# Altium footprint library texas.PCBLIB: 168 footprints (part 13 of 14)
Each footprint in its own frame and in the unit in brackets; x right, y up, seen from the top. Pads: shape width x height; smd on the part's side, far side on the other; paste and mask are expansions set on the pad; w line width, h text height; cw(c..) or ccw(c..) is an arc to the next point about the centre after c.
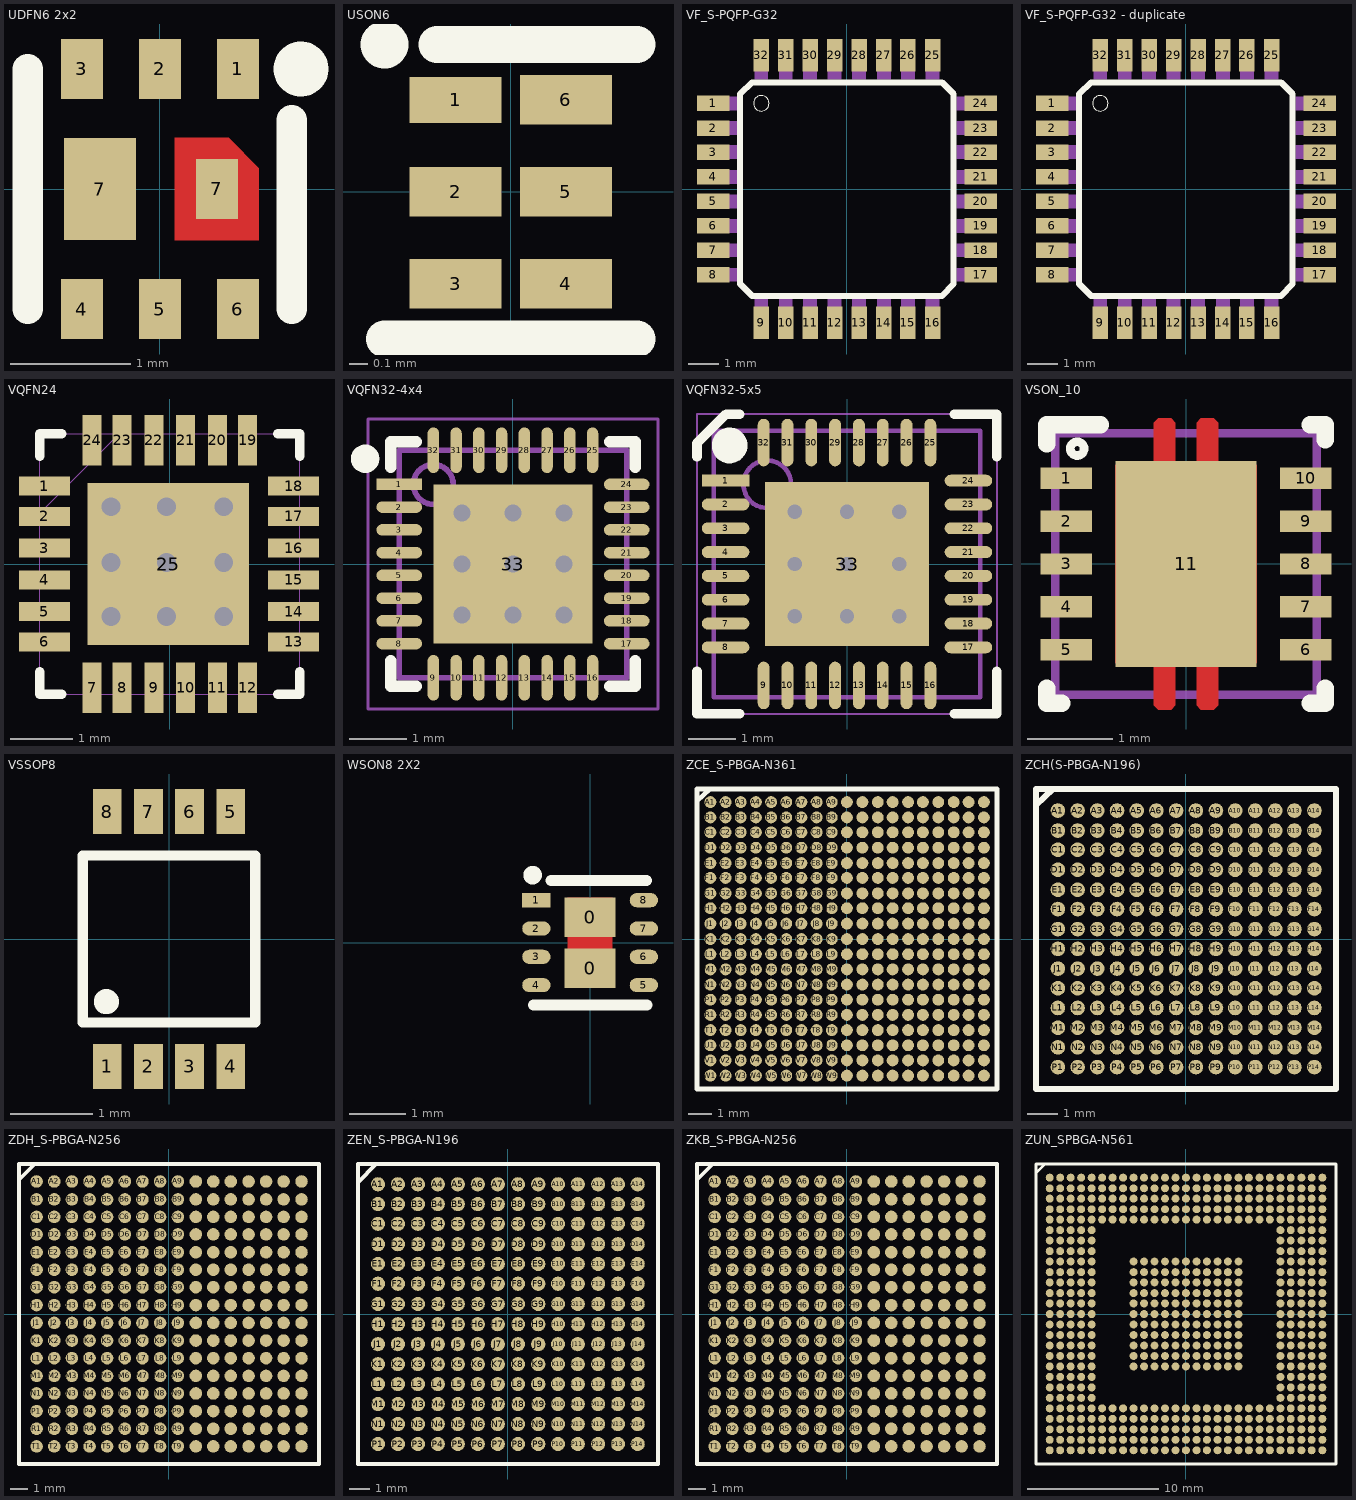
[diagram p12: the footprints below, top view; thin cyan lines are the x and y axes]

## UDFN6 2x2 [mm] "UDFN6 2x2, 0.65P  CASE 517BF"
height 0.55
pads (8):
  rect 0.35x0.5 smd: 1(0.65,1) 2(0,1) 3(-0.65,1) 4(-0.65,-1) 5(0,-1) 6(0.65,-1) 7(0.475,0.001)
  rect 0.6x0.85 smd: 7(-0.5,0)
Top Layer:
  region: 0.575,0.425 0.825,0.175 0.825,-0.425 0.125,-0.425 0.125,0.425
Top Overlay:
  circle w0.305: c1.175,1 r0.076
  lines w0.254: -1.1,-1 -1.1,1 ; 1.1,-1 1.1,0.575
Top Solder:
  region: 0.6,0.55 0.925,0.225 0.925,-0.525 0.025,-0.525 0.025,0.55
3D body: height 0.55, standoff 0, extent -1,-1 1,1

## USON6 [mm] "USON6 1x1.45"
height 0.6
pads (6):
  rect 0.5x0.25 smd mask+0.05: 1(-0.3,0.5)
  rect 0.5x0.27 smd mask+0.05: 2(-0.3,0) 3(-0.3,-0.5) 4(0.3,-0.5) 5(0.3,0) 6(0.3,0.5)
Top Overlay:
  circle w0.2: c-0.686,0.8 r0.03
  lines w0.2: -0.686,-0.8 0.686,-0.8 ; -0.4,0.8 0.686,0.8
3D body: height 0.6, standoff 0.05, extent -0.559,-0.711 0.559,0.711

## VF_S-PQFP-G32 [mil]
pads (32):
  rect 42x20 smd: 1(-172.24,111) 2(-172.24,79) 3(-172.24,48) 4(-172.24,16) 5(-172.24,-15.75) 6(-172.24,-47.24) 7(-172.24,-78.74) 8(-172.24,-110.24) 17(173,-110.24) 18(173,-78.74) 19(173,-47.24) 20(173,-15.75) 21(173,16) 22(173,48) 23(173,79) 24(173,111)
  rect 20x42 smd: 9(-110.24,-172.24) 10(-78.74,-172.24) 11(-47.24,-172.24) 12(-15.75,-172.24) 13(16,-172.24) 14(48,-172.24) 15(79,-172.24) 16(111,-172.24) 25(111,173) 26(79,173) 27(48,173) 28(16,173) 29(-15.75,173) 30(-47.24,173) 31(-78.74,173) 32(-110.24,173)
Top Overlay:
  circle w0: c-110.24,111 r10
  lines w8: -137.73,-122.05 -122.05,-137.73 123,-137.73 138,-122.05 138,123 123,138 -122.05,138 -137.73,123 -137.73,-122.05
Mechanical 4:
  rectangle: -181.1,102 -141.73,120
  rectangle: -181.1,70 -141.73,88
  rectangle: -181.1,39 -141.73,57
  rectangle: -181.1,7 -141.73,25
  rectangle: -181.1,-24.61 -141.73,-6.89
  rectangle: -181.1,-56.1 -141.73,-38.39
  rectangle: -181.1,-87.6 -141.73,-69.88
  rectangle: -181.1,-119.09 -141.73,-101.38
  rectangle: -119.09,-181.1 -101.38,-141.73
  rectangle: -87.6,-181.1 -69.88,-141.73
  rectangle: -56.1,-181.1 -38.39,-141.73
  rectangle: -24.61,-181.1 -6.89,-141.73
  rectangle: 7,-181.1 25,-141.73
  rectangle: 39,-181.1 57,-141.73
  rectangle: 70,-181.1 88,-141.73
  rectangle: 102,-181.1 120,-141.73
  rectangle: 142,-119.09 182,-101.38
  rectangle: 142,-87.6 182,-69.88
  rectangle: 142,-56.1 182,-38.39
  rectangle: 142,-24.61 182,-6.89
  rectangle: 142,7 182,25
  rectangle: 142,39 182,57
  rectangle: 142,70 182,88
  rectangle: 142,102 182,120
  rectangle: 102,142 120,182
  rectangle: 70,142 88,182
  rectangle: 39,142 57,182
  rectangle: 7,142 25,182
  rectangle: -24.61,142 -6.89,182
  rectangle: -56.1,142 -38.39,182
  rectangle: -87.6,142 -69.88,182
  rectangle: -119.09,142 -101.38,182

## VF_S-PQFP-G32 - duplicate [mil]
pads (32):
  rect 42x20 smd: 1(-172.24,111) 2(-172.24,79) 3(-172.24,48) 4(-172.24,16) 5(-172.24,-15.75) 6(-172.24,-47.24) 7(-172.24,-78.74) 8(-172.24,-110.24) 17(173,-110.24) 18(173,-78.74) 19(173,-47.24) 20(173,-15.75) 21(173,16) 22(173,48) 23(173,79) 24(173,111)
  rect 20x42 smd: 9(-110.24,-172.24) 10(-78.74,-172.24) 11(-47.24,-172.24) 12(-15.75,-172.24) 13(16,-172.24) 14(48,-172.24) 15(79,-172.24) 16(111,-172.24) 25(111,173) 26(79,173) 27(48,173) 28(16,173) 29(-15.75,173) 30(-47.24,173) 31(-78.74,173) 32(-110.24,173)
Top Overlay:
  circle w0: c-110.24,111 r10
  lines w8: -137.73,-122.05 -137.73,123 -122.05,138 123,138 138,123 138,-122.05 123,-137.73 -122.05,-137.73 -137.73,-122.05
Mechanical 4:
  rectangle: -119.09,142 -101.38,182
  rectangle: -87.6,142 -69.88,182
  rectangle: -56.1,142 -38.39,182
  rectangle: -24.61,142 -6.89,182
  rectangle: 7,142 25,182
  rectangle: 39,142 57,182
  rectangle: 70,142 88,182
  rectangle: 102,142 120,182
  rectangle: 142,102 182,120
  rectangle: 142,70 182,88
  rectangle: 142,39 182,57
  rectangle: 142,7 182,25
  rectangle: 142,-24.61 182,-6.89
  rectangle: 142,-56.1 182,-38.39
  rectangle: 142,-87.6 182,-69.88
  rectangle: 142,-119.09 182,-101.38
  rectangle: 102,-181.1 120,-141.73
  rectangle: 70,-181.1 88,-141.73
  rectangle: 39,-181.1 57,-141.73
  rectangle: 7,-181.1 25,-141.73
  rectangle: -24.61,-181.1 -6.89,-141.73
  rectangle: -56.1,-181.1 -38.39,-141.73
  rectangle: -87.6,-181.1 -69.88,-141.73
  rectangle: -119.09,-181.1 -101.38,-141.73
  rectangle: -181.1,-119.09 -141.73,-101.38
  rectangle: -181.1,-87.6 -141.73,-69.88
  rectangle: -181.1,-56.1 -141.73,-38.39
  rectangle: -181.1,-24.61 -141.73,-6.89
  rectangle: -181.1,7 -141.73,25
  rectangle: -181.1,39 -141.73,57
  rectangle: -181.1,70 -141.73,88
  rectangle: -181.1,102 -141.73,120

## VQFN24 [mil]
pads (25):
  rect 32x12 smd: 1(-79,49) 2(-79,30) 3(-79,10) 4(-79,-10) 5(-79,-30) 6(-79,-49) 13(78,-49) 14(78,-30) 15(78,-10) 16(78,10) 17(78,30) 18(78,49)
  rect 12x32 smd: 7(-49,-78) 8(-30,-78) 9(-10,-78) 10(10,-78) 11(30,-78) 12(49,-78) 19(49,78) 20(30,78) 21(10,78) 22(-10,78) 23(-30,78) 24(-49,78)
  rect 102x102 smd: 25(-1,0)
via 34,-33 diameter 19.68 hole 11.81
via -2,-33 diameter 19.68 hole 11.81
via -37,-33 diameter 19.68 hole 11.81
via 34,1 diameter 19.68 hole 11.81
via -2,1 diameter 19.68 hole 11.81
via -37,1 diameter 19.68 hole 11.81
via 34,36 diameter 19.68 hole 11.81
via -2,36 diameter 19.68 hole 11.81
via -37,36 diameter 19.68 hole 11.81
Top Overlay:
  lines w6: -82,-68 -82,-82 -68,-82 ; -82,68 -82,82 -68,82 ; 68,-82 82,-82 82,-68 ; 68,82 82,82 82,68
Mechanical 4:
  lines w0: -82,-82 82,-82 ; -82,-82 -82,82 ; -82,-82 82,-82 ; -82,-82 -82,82 ; -82,82 82,82 ; -82,82 82,82 ; 82,-82 82,82 ; 82,-82 82,82 ; -82,-55 -82,-43 -82,-55 ; -82,-35 -82,-24 -82,-35 ; -82,-16 -82,-4 -82,-16 ; -82,4 -82,16 -82,4 ; -82,24 -82,35 -82,24 ; -82,32 -32,82 -82,32 ; -82,43 -82,55 -82,43 ; -55,-82 -43,-82 -55,-82 ; -55,82 -43,82 -55,82 ; -35,-82 -24,-82 -35,-82 ; -35,82 -24,82 -35,82 ; -16,-82 -4,-82 -16,-82 ; -16,82 -4,82 -16,82 ; 4,-82 16,-82 4,-82 ; 4,82 16,82 4,82 ; 24,-82 35,-82 24,-82 ; 24,82 35,82 24,82 ; 43,-82 55,-82 43,-82 ; 43,82 55,82 43,82 ; 82,-55 82,-43 82,-55 ; 82,-35 82,-24 82,-35 ; 82,-16 82,-4 82,-16 ; 82,4 82,16 82,4 ; 82,24 82,35 82,24 ; 82,43 82,55 82,43

## VQFN32-4x4 [mm] "QFN, 32-Leads, Body 4x4mm, Pitch 0.4mm, Thermal Pad 2.8x2.8mm, IPC Medium Density"
height 1
pads (33):
  rect 0.8x0.2 smd: 1(-2,1.4)
  oval 0.8x0.2 smd: 2(-2,1) 3(-2,0.6) 4(-2,0.2) 5(-2,-0.2) 6(-2,-0.6) 7(-2,-1) 8(-2,-1.4) 17(2,-1.4) 18(2,-1) 19(2,-0.6) 20(2,-0.2) 21(2,0.2) 22(2,0.6) 23(2,1) 24(2,1.4)
  oval 0.2x0.8 smd: 9(-1.4,-2) 10(-1,-2) 11(-0.6,-2) 12(-0.2,-2) 13(0.2,-2) 14(0.6,-2) 15(1,-2) 16(1.4,-2) 25(1.4,2) 26(1,2) 27(0.6,2) 28(0.2,2) 29(-0.2,2) 30(-0.6,2) 31(-1,2) 32(-1.4,2)
  rect 2.8x2.8 smd: 33(0,0)
via 0.9,-0.9 diameter 0.5 hole 0.3
via 0,-0.9 diameter 0.5 hole 0.3
via -0.9,-0.9 diameter 0.5 hole 0.3
via 0.9,0 diameter 0.5 hole 0.3
via 0,0 diameter 0.5 hole 0.3
via -0.9,0 diameter 0.5 hole 0.3
via 0.9,0.9 diameter 0.5 hole 0.3
via 0,0.9 diameter 0.5 hole 0.3
via -0.9,0.9 diameter 0.5 hole 0.3
Top Overlay:
  circle w0.25: c-2.6,1.85 r0.125
  lines w0.2: -2.15,-1.7 -2.15,-2.15 -1.7,-2.15 ; -2.15,1.7 -2.15,2.15 -1.7,2.15 ; 1.7,-2.15 2.15,-2.15 2.15,-1.7 ; 1.7,2.15 2.15,2.15 2.15,1.7
Mechanical 13:
  circle w0.1: c-1.4,1.4 r0.35
  lines w0.1: -2,-2 2,-2 2,2 -2,2 -2,-2
Mechanical 15:
  lines w0.05: -2.55,-2.55 2.55,-2.55 2.55,2.55 -2.55,2.55 -2.55,-2.55
  lines w0.1: -0.5,0 0.5,0 ; 0,-0.5 0,0.5
3D body: height 1, standoff 0, extent -2,-2 2,2

## VQFN32-5x5 [mm] "QFN, 32-Leads, Body 5x5mm, Pitch 0.5mm, Thermal Pad 3.45x3.45mm, IPC Medium Density"
height 1
pads (33):
  rect 1x0.25 smd: 1(-2.55,1.75)
  oval 1x0.25 smd: 2(-2.55,1.25) 3(-2.55,0.75) 4(-2.55,0.25) 5(-2.55,-0.25) 6(-2.55,-0.75) 7(-2.55,-1.25) 8(-2.55,-1.75) 17(2.55,-1.75) 18(2.55,-1.25) 19(2.55,-0.75) 20(2.55,-0.25) 21(2.55,0.25) 22(2.55,0.75) 23(2.55,1.25) 24(2.55,1.75)
  oval 0.25x1 smd: 9(-1.75,-2.55) 10(-1.25,-2.55) 11(-0.75,-2.55) 12(-0.25,-2.55) 13(0.25,-2.55) 14(0.75,-2.55) 15(1.25,-2.55) 16(1.75,-2.55) 25(1.75,2.55) 26(1.25,2.55) 27(0.75,2.55) 28(0.25,2.55) 29(-0.25,2.55) 30(-0.75,2.55) 31(-1.25,2.55) 32(-1.75,2.55)
  rect 3.45x3.45 smd: 33(0,0)
via -1.1,1.1 diameter 0.5 hole 0.3
via 0,1.1 diameter 0.5 hole 0.3
via 1.1,1.1 diameter 0.5 hole 0.3
via -1.1,0 diameter 0.5 hole 0.3
via 0,0 diameter 0.5 hole 0.3
via 1.1,0 diameter 0.5 hole 0.3
via -1.1,-1.1 diameter 0.5 hole 0.3
via 0,-1.1 diameter 0.5 hole 0.3
via 1.1,-1.1 diameter 0.5 hole 0.3
Top Overlay:
  circle w0.4: c-2.464,2.489 r0.175
  lines w0.2: -3.15,-2.25 -3.15,-3.15 -2.25,-3.15 ; -3.15,2.25 -3.15,2.54 -2.54,3.15 -2.25,3.15 ; 2.25,-3.15 3.15,-3.15 3.15,-2.25 ; 2.25,3.15 3.15,3.15 3.15,2.25
Mechanical 13:
  circle w0.1: c-1.675,1.675 r0.5
  lines w0.1: -2.8,-2.8 -2.8,2.8 2.8,2.8 2.8,-2.8 -2.8,-2.8
Mechanical 15:
  lines w0.05: -3.15,-3.15 -3.15,3.15 3.15,3.15 3.15,-3.15 -3.15,-3.15
  lines w0.1: -0.5,0 0.5,0 ; 0,-0.5 0,0.5
3D body: height 1, standoff 0, extent -2.794,-2.794 2.794,2.794

## VSON_10 [mm]
pads (11):
  rect 0.6x0.25 smd paste+0 mask+0.051: 1(-1.4,1) 2(-1.4,0.5) 3(-1.4,0) 4(-1.4,-0.5) 5(-1.4,-1) 6(1.4,-1) 7(1.4,-0.5) 8(1.4,0) 9(1.4,0.5) 10(1.4,1)
  rect 1.65x2.4 smd paste-1.187 mask-1.181: 11(0,0)
Top Layer:
  region: -0.825,-1.15 -0.775,-1.2 -0.375,-1.2 -0.375,-1.65 -0.325,-1.7 -0.175,-1.7 -0.125,-1.65 -0.125,-1.2 0.125,-1.2 0.125,-1.65 0.175,-1.7 0.325,-1.7 0.375,-1.65 0.375,-1.2 0.775,-1.2 0.825,-1.15 0.825,1.15 0.775,1.2 0.375,1.2 0.375,1.65 0.325,1.7 0.175,1.7 0.125,1.65 0.125,1.2 -0.125,1.2 -0.125,1.65 -0.175,1.7 -0.325,1.7 -0.375,1.65 -0.375,1.2 -0.775,1.2 -0.825,1.15
Top Overlay:
  circle w0.1: c-1.27,1.346 r0.08
  lines w0.2: -1.625,-1.45 -1.625,-1.625 -1.45,-1.625 ; -1.625,1.4 -1.625,1.625 -1,1.625 ; 1.45,-1.625 1.625,-1.625 1.625,-1.45 ; 1.45,1.625 1.625,1.625 1.625,1.45
Top Paste:
  drawing of 6 lines, arcs and shapes, not listed
Top Solder:
  region: -0.803,-1.242 -0.811,-1.236 -0.861,-1.186 -0.867,-1.178 -0.872,-1.169 -0.875,-1.16 -0.876,-1.15 -0.876,1.15 -0.875,1.16 -0.872,1.169 -0.867,1.178 -0.861,1.186 -0.811,1.236 -0.803,1.242 -0.794,1.247 -0.785,1.25 -0.775,1.251 -0.426,1.251 -0.426,1.65 -0.425,1.66 -0.422,1.669 -0.417,1.678 -0.411,1.686 -0.361,1.736 -0.353,1.742 -0.344,1.747 -0.335,1.75 -0.325,1.751 -0.175,1.751 -0.165,1.75 -0.156,1.747 -0.147,1.742 -0.139,1.736 -0.089,1.686 -0.083,1.678 -0.078,1.669 -0.075,1.66 -0.074,1.65 -0.074,1.251 0.074,1.251 0.074,1.65 0.075,1.66 0.078,1.669 0.083,1.678 0.089,1.686 0.139,1.736 0.147,1.742 0.156,1.747 0.165,1.75 0.175,1.751 0.325,1.751 0.335,1.75 0.344,1.747 0.353,1.742 0.361,1.736 0.411,1.686 0.417,1.678 0.422,1.669 0.425,1.66 0.426,1.65 0.426,1.251 0.775,1.251 0.785,1.25 0.794,1.247 0.803,1.242 0.811,1.236 0.861,1.186 0.867,1.178 0.872,1.169 0.875,1.16 0.876,1.15 0.876,-1.15 0.875,-1.16 0.872,-1.169 0.867,-1.178 0.861,-1.186 0.811,-1.236 0.803,-1.242 0.794,-1.247 0.785,-1.25 0.775,-1.251 0.426,-1.251 0.426,-1.65 0.425,-1.66 0.422,-1.669 0.417,-1.678 0.411,-1.686 0.361,-1.736 0.353,-1.742 0.344,-1.747 0.335,-1.75 0.325,-1.751 0.175,-1.751 0.165,-1.75 0.156,-1.747 0.147,-1.742 0.139,-1.736 0.089,-1.686 0.083,-1.678 0.078,-1.669 0.075,-1.66 0.074,-1.65 0.074,-1.251 -0.074,-1.251 -0.074,-1.65 -0.075,-1.66 -0.078,-1.669 -0.083,-1.678 -0.089,-1.686 -0.139,-1.736 -0.147,-1.742 -0.156,-1.747 -0.165,-1.75 -0.175,-1.751 -0.325,-1.751 -0.335,-1.75 -0.344,-1.747 -0.353,-1.742 -0.361,-1.736 -0.411,-1.686 -0.417,-1.678 -0.422,-1.669 -0.425,-1.66 -0.426,-1.65 -0.426,-1.251 -0.775,-1.251 -0.785,-1.25 -0.794,-1.247
Mechanical 4:
  lines w0.1: -1.525,-1.525 -1.525,1.525 1.525,1.525 1.525,-1.525 -1.525,-1.525
3D body "DRC0010J.stp": height 0.77, standoff 0, extent -1.5,-1.5 1.5,1.5
3D body: height 0.25, standoff 0, extent 0,0 0.254,0.254

## VSSOP8 [mm]
pads (8):
  rect 0.35x0.55 smd: 1(-0.75,-1.55) 2(-0.25,-1.55) 3(0.25,-1.55) 4(0.75,-1.55) 5(0.75,1.55) 6(0.25,1.55) 7(-0.25,1.55) 8(-0.75,1.55)
Top Overlay:
  circle w0.254: c-0.762,-0.762 r0.025
  lines w0.127: -1.05,-1.016 1.05,-1.016 1.05,1.016 0.525,1.016 -0.525,1.016 -1.05,1.016 -1.05,-1.016
3D body "User Library-SOP50P310X90-8N[8US8_VSSOP_DCU_MO-187CA].step": height 0.9, standoff 0, extent -1.05,-1.6 1.05,1.6

## WSON8 2X2 [mm]
height 0.8
pads (10):
  rect 0.9x0.7 smd paste+0: 0(0,-0.45) 0(0,0.45)
  rect 0.5x0.25 smd mask+0.051: 1(-0.95,0.75)
  oval 0.5x0.25 smd mask+0.051: 2(-0.95,0.25) 3(-0.95,-0.25) 4(-0.95,-0.75) 5(0.95,-0.75) 6(0.95,-0.25) 7(0.95,0.25) 8(0.95,0.75)
Top Layer:
  rectangle: -0.4,-0.8 0.4,0.8
Top Overlay:
  circle w0.254: c-1.016,1.194 r0.036
  lines w0.2: -1,-1.1 1,-1.1 ; -0.689,1.1 0.991,1.1
Top Paste:
  region: -4.102,-0.279
Top Solder:
  rectangle: -0.4,-0.8 0.4,0.8
3D body: height 0.8, standoff 0.05, extent -1.016,-1.016 1.016,1.016

## ZCE_S-PBGA-N361 [mil]
pads (361):
  rrect100% 20x20 smd: A1(-230.31,231) A2(-204.72,231) A3(-179.13,231) A4(-153.54,231) A5(-127.95,231) A6(-102.36,231) A7(-76.77,231) A8(-51.18,231) A9(-25.59,231) A10(0,231) A11(26,231) A12(52,231) A13(77,231) A14(103,231) A15(128,231) A16(154,231) A17(180,231) A18(205,231) A19(231,231) B1(-230.31,205) B2(-204.72,205) B3(-179.13,205) B4(-153.54,205) B5(-127.95,205) B6(-102.36,205) B7(-76.77,205) B8(-51.18,205) B9(-25.59,205) B10(0,205) B11(26,205) B12(52,205) B13(77,205) B14(103,205) B15(128,205) B16(154,205) B17(180,205) B18(205,205) B19(231,205) C1(-230.31,180) C2(-204.72,180) C3(-179.13,180) C4(-153.54,180) C5(-127.95,180) C6(-102.36,180) C7(-76.77,180) C8(-51.18,180) C9(-25.59,180) C10(0,180) C11(26,180) C12(52,180) C13(77,180) C14(103,180) C15(128,180) C16(154,180) C17(180,180) C18(205,180) C19(231,180) D1(-230.31,154) D2(-204.72,154) D3(-179.13,154) D4(-153.54,154) D5(-127.95,154) D6(-102.36,154) D7(-76.77,154) D8(-51.18,154) D9(-25.59,154) D10(0,154) D11(26,154) D12(52,154) D13(77,154) D14(103,154) D15(128,154) D16(154,154) D17(180,154) D18(205,154) D19(231,154) E1(-230.31,128) E2(-204.72,128) E3(-179.13,128) E4(-153.54,128) E5(-127.95,128) E6(-102.36,128) E7(-76.77,128) E8(-51.18,128) E9(-25.59,128) E10(0,128) E11(26,128) E12(52,128) E13(77,128) E14(103,128) E15(128,128) E16(154,128) E17(180,128) E18(205,128) E19(231,128) F1(-230.31,103) F2(-204.72,103) F3(-179.13,103) F4(-153.54,103) F5(-127.95,103) F6(-102.36,103) F7(-76.77,103) F8(-51.18,103) F9(-25.59,103) F10(0,103) F11(26,103) F12(52,103) F13(77,103) F14(103,103) F15(128,103) F16(154,103) F17(180,103) F18(205,103) F19(231,103) G1(-230.31,77) G2(-204.72,77) G3(-179.13,77) G4(-153.54,77) G5(-127.95,77) G6(-102.36,77) G7(-76.77,77) G8(-51.18,77) G9(-25.59,77) G10(0,77) G11(26,77) G12(52,77) G13(77,77) G14(103,77) G15(128,77) G16(154,77) G17(180,77) G18(205,77) G19(231,77) H1(-230.31,52) H2(-204.72,52) H3(-179.13,52) H4(-153.54,52) H5(-127.95,52) H6(-102.36,52) H7(-76.77,52) H8(-51.18,52) H9(-25.59,52) H10(0,52) H11(26,52) H12(52,52) H13(77,52) H14(103,52) H15(128,52) H16(154,52) H17(180,52) H18(205,52) H19(231,52) J1(-230.31,26) J2(-204.72,26) J3(-179.13,26) J4(-153.54,26) J5(-127.95,26) J6(-102.36,26) J7(-76.77,26) J8(-51.18,26) J9(-25.59,26) J10(0,26) J11(26,26) J12(52,26) J13(77,26) J14(103,26) J15(128,26) J16(154,26) J17(180,26) J18(205,26) J19(231,26) K1(-230.31,0) K2(-204.72,0) K3(-179.13,0) K4(-153.54,0) K5(-127.95,0) K6(-102.36,0) K7(-76.77,0) K8(-51.18,0) K9(-25.59,0) K10(0,0) K11(26,0) K12(52,0) K13(77,0) K14(103,0) K15(128,0) K16(154,0) K17(180,0) K18(205,0) K19(231,0) L1(-230.31,-25.59) L2(-204.72,-25.59) L3(-179.13,-25.59) L4(-153.54,-25.59) L5(-127.95,-25.59) L6(-102.36,-25.59) L7(-76.77,-25.59) L8(-51.18,-25.59) L9(-25.59,-25.59) L10(0,-25.59) L11(26,-25.59) L12(52,-25.59) L13(77,-25.59) L14(103,-25.59) L15(128,-25.59) L16(154,-25.59) L17(180,-25.59) L18(205,-25.59) L19(231,-25.59) M1(-230.31,-51.18) M2(-204.72,-51.18) M3(-179.13,-51.18) M4(-153.54,-51.18) M5(-127.95,-51.18) M6(-102.36,-51.18) M7(-76.77,-51.18) M8(-51.18,-51.18) M9(-25.59,-51.18) M10(0,-51.18) M11(26,-51.18) M12(52,-51.18) M13(77,-51.18) M14(103,-51.18) M15(128,-51.18) M16(154,-51.18) M17(180,-51.18) M18(205,-51.18) M19(231,-51.18) N1(-230.31,-76.77) N2(-204.72,-76.77) N3(-179.13,-76.77) N4(-153.54,-76.77) N5(-127.95,-76.77) N6(-102.36,-76.77) N7(-76.77,-76.77) N8(-51.18,-76.77) N9(-25.59,-76.77) N10(0,-76.77) N11(26,-76.77) N12(52,-76.77) N13(77,-76.77) N14(103,-76.77) N15(128,-76.77) N16(154,-76.77) N17(180,-76.77) N18(205,-76.77) N19(231,-76.77) P1(-230.31,-102.36) P2(-204.72,-102.36) P3(-179.13,-102.36) P4(-153.54,-102.36) P5(-127.95,-102.36) P6(-102.36,-102.36) P7(-76.77,-102.36) P8(-51.18,-102.36) P9(-25.59,-102.36) P10(0,-102.36) P11(26,-102.36) P12(52,-102.36) P13(77,-102.36) P14(103,-102.36) P15(128,-102.36) P16(154,-102.36) P17(180,-102.36) P18(205,-102.36) P19(231,-102.36) R1(-230.31,-127.95) R2(-204.72,-127.95) R3(-179.13,-127.95) R4(-153.54,-127.95) R5(-127.95,-127.95) R6(-102.36,-127.95) R7(-76.77,-127.95) R8(-51.18,-127.95) R9(-25.59,-127.95) R10(0,-127.95) R11(26,-127.95) R12(52,-127.95) R13(77,-127.95) R14(103,-127.95) R15(128,-127.95) R16(154,-127.95) R17(180,-127.95) R18(205,-127.95) R19(231,-127.95) T1(-230.31,-153.54) T2(-204.72,-153.54) T3(-179.13,-153.54) T4(-153.54,-153.54) T5(-127.95,-153.54) T6(-102.36,-153.54) T7(-76.77,-153.54) T8(-51.18,-153.54) T9(-25.59,-153.54) T10(0,-153.54) T11(26,-153.54) T12(52,-153.54) T13(77,-153.54) T14(103,-153.54) T15(128,-153.54) T16(154,-153.54) T17(180,-153.54) T18(205,-153.54) T19(231,-153.54) U1(-230.31,-179.13) U2(-204.72,-179.13) U3(-179.13,-179.13) U4(-153.54,-179.13) U5(-127.95,-179.13) U6(-102.36,-179.13) U7(-76.77,-179.13) U8(-51.18,-179.13) U9(-25.59,-179.13) U10(0,-179.13) U11(26,-179.13) U12(52,-179.13) U13(77,-179.13) U14(103,-179.13) U15(128,-179.13) U16(154,-179.13) U17(180,-179.13) U18(205,-179.13) U19(231,-179.13) V1(-230.31,-204.72) V2(-204.72,-204.72) V3(-179.13,-204.72) V4(-153.54,-204.72) V5(-127.95,-204.72) V6(-102.36,-204.72) V7(-76.77,-204.72) V8(-51.18,-204.72) V9(-25.59,-204.72) V10(0,-204.72) V11(26,-204.72) V12(52,-204.72) V13(77,-204.72) V14(103,-204.72) V15(128,-204.72) V16(154,-204.72) V17(180,-204.72) V18(205,-204.72) V19(231,-204.72) W1(-230.31,-230.31) W2(-204.72,-230.31) W3(-179.13,-230.31) W4(-153.54,-230.31) W5(-127.95,-230.31) W6(-102.36,-230.31) W7(-76.77,-230.31) W8(-51.18,-230.31) W9(-25.59,-230.31) W10(0,-230.31) W11(26,-230.31) W12(52,-230.31) W13(77,-230.31) W14(103,-230.31) W15(128,-230.31) W16(154,-230.31) W17(180,-230.31) W18(205,-230.31) W19(231,-230.31)
Top Overlay:
  lines w8: -252.89,232 -231.3,253 ; -252.89,232 -252.89,-252.89 253,-252.89 253,253 -231.3,253 ; -252.89,232 -252.89,253 -231.3,253
Top Solder:
  drawing of 361 lines, arcs and shapes, not listed

## ZCH(S-PBGA-N196) [mil]
pads (196):
  rrect100% 19x19 smd: A1(-166.34,167) A2(-140.75,167) A3(-115.16,167) A4(-89.57,167) A5(-63.98,167) A6(-38.39,167) A7(-12.8,167) A8(13,167) A9(39,167) A10(64,167) A11(90,167) A12(116,167) A13(141,167) A14(167,167) B1(-166.34,141) B2(-140.75,141) B3(-115.16,141) B4(-89.57,141) B5(-63.98,141) B6(-38.39,141) B7(-12.8,141) B8(13,141) B9(39,141) B10(64,141) B11(90,141) B12(116,141) B13(141,141) B14(167,141) C1(-166.34,116) C2(-140.75,116) C3(-115.16,116) C4(-89.57,116) C5(-63.98,116) C6(-38.39,116) C7(-12.8,116) C8(13,116) C9(39,116) C10(64,116) C11(90,116) C12(116,116) C13(141,116) C14(167,116) D1(-166.34,90) D2(-140.75,90) D3(-115.16,90) D4(-89.57,90) D5(-63.98,90) D6(-38.39,90) D7(-12.8,90) D8(13,90) D9(39,90) D10(64,90) D11(90,90) D12(116,90) D13(141,90) D14(167,90) E1(-166.34,64) E2(-140.75,64) E3(-115.16,64) E4(-89.57,64) E5(-63.98,64) E6(-38.39,64) E7(-12.8,64) E8(13,64) E9(39,64) E10(64,64) E11(90,64) E12(116,64) E13(141,64) E14(167,64) F1(-166.34,39) F2(-140.75,39) F3(-115.16,39) F4(-89.57,39) F5(-63.98,39) F6(-38.39,39) F7(-12.8,39) F8(13,39) F9(39,39) F10(64,39) F11(90,39) F12(116,39) F13(141,39) F14(167,39) G1(-166.34,13) G2(-140.75,13) G3(-115.16,13) G4(-89.57,13) G5(-63.98,13) G6(-38.39,13) G7(-12.8,13) G8(13,13) G9(39,13) G10(64,13) G11(90,13) G12(116,13) G13(141,13) G14(167,13) H1(-166.34,-12.8) H2(-140.75,-12.8) H3(-115.16,-12.8) H4(-89.57,-12.8) H5(-63.98,-12.8) H6(-38.39,-12.8) H7(-12.8,-12.8) H8(13,-12.8) H9(39,-12.8) H10(64,-12.8) H11(90,-12.8) H12(116,-12.8) H13(141,-12.8) H14(167,-12.8) J1(-166.34,-38.39) J2(-140.75,-38.39) J3(-115.16,-38.39) J4(-89.57,-38.39) J5(-63.98,-38.39) J6(-38.39,-38.39) J7(-12.8,-38.39) J8(13,-38.39) J9(39,-38.39) J10(64,-38.39) J11(90,-38.39) J12(116,-38.39) J13(141,-38.39) J14(167,-38.39) K1(-166.34,-63.98) K2(-140.75,-63.98) K3(-115.16,-63.98) K4(-89.57,-63.98) K5(-63.98,-63.98) K6(-38.39,-63.98) K7(-12.8,-63.98) K8(13,-63.98) K9(39,-63.98) K10(64,-63.98) K11(90,-63.98) K12(116,-63.98) K13(141,-63.98) K14(167,-63.98) L1(-166.34,-89.57) L2(-140.75,-89.57) L3(-115.16,-89.57) L4(-89.57,-89.57) L5(-63.98,-89.57) L6(-38.39,-89.57) L7(-12.8,-89.57) L8(13,-89.57) L9(39,-89.57) L10(64,-89.57) L11(90,-89.57) L12(116,-89.57) L13(141,-89.57) L14(167,-89.57) M1(-166.34,-115.16) M2(-140.75,-115.16) M3(-115.16,-115.16) M4(-89.57,-115.16) M5(-63.98,-115.16) M6(-38.39,-115.16) M7(-12.8,-115.16) M8(13,-115.16) M9(39,-115.16) M10(64,-115.16) M11(90,-115.16) M12(116,-115.16) M13(141,-115.16) M14(167,-115.16) N1(-166.34,-140.75) N2(-140.75,-140.75) N3(-115.16,-140.75) N4(-89.57,-140.75) N5(-63.98,-140.75) N6(-38.39,-140.75) N7(-12.8,-140.75) N8(13,-140.75) N9(39,-140.75) N10(64,-140.75) N11(90,-140.75) N12(116,-140.75) N13(141,-140.75) N14(167,-140.75) P1(-166.34,-166.34) P2(-140.75,-166.34) P3(-115.16,-166.34) P4(-89.57,-166.34) P5(-63.98,-166.34) P6(-38.39,-166.34) P7(-12.8,-166.34) P8(13,-166.34) P9(39,-166.34) P10(64,-166.34) P11(90,-166.34) P12(116,-166.34) P13(141,-166.34) P14(167,-166.34)
Top Overlay:
  lines w8: -194.82,174 -173.23,195 ; -194.82,174 -194.82,-194.82 195,-194.82 195,195 -173.23,195 ; -194.82,174 -194.82,195 -173.23,195
Top Solder:
  drawing of 196 lines, arcs and shapes, not listed

## ZDH_S-PBGA-N256 [mil]
pads (256):
  rrect100% 28x28 smd: A1(-295.28,296) A2(-255.91,296) A3(-216.54,296) A4(-177.17,296) A5(-137.8,296) A6(-98.43,296) A7(-59.06,296) A8(-19.68,296) A9(20,296) A10(60,296) A11(99,296) A12(138,296) A13(178,296) A14(217,296) A15(256,296) A16(296,296) B1(-295.28,256) B2(-255.91,256) B3(-216.54,256) B4(-177.17,256) B5(-137.8,256) B6(-98.43,256) B7(-59.06,256) B8(-19.68,256) B9(20,256) B10(60,256) B11(99,256) B12(138,256) B13(178,256) B14(217,256) B15(256,256) B16(296,256) C1(-295.28,217) C2(-255.91,217) C3(-216.54,217) C4(-177.17,217) C5(-137.8,217) C6(-98.43,217) C7(-59.06,217) C8(-19.68,217) C9(20,217) C10(60,217) C11(99,217) C12(138,217) C13(178,217) C14(217,217) C15(256,217) C16(296,217) D1(-295.28,178) D2(-255.91,178) D3(-216.54,178) D4(-177.17,178) D5(-137.8,178) D6(-98.43,178) D7(-59.06,178) D8(-19.68,178) D9(20,178) D10(60,178) D11(99,178) D12(138,178) D13(178,178) D14(217,178) D15(256,178) D16(296,178) E1(-295.28,138) E2(-255.91,138) E3(-216.54,138) E4(-177.17,138) E5(-137.8,138) E6(-98.43,138) E7(-59.06,138) E8(-19.68,138) E9(20,138) E10(60,138) E11(99,138) E12(138,138) E13(178,138) E14(217,138) E15(256,138) E16(296,138) F1(-295.28,99) F2(-255.91,99) F3(-216.54,99) F4(-177.17,99) F5(-137.8,99) F6(-98.43,99) F7(-59.06,99) F8(-19.68,99) F9(20,99) F10(60,99) F11(99,99) F12(138,99) F13(178,99) F14(217,99) F15(256,99) F16(296,99) G1(-295.28,60) G2(-255.91,60) G3(-216.54,60) G4(-177.17,60) G5(-137.8,60) G6(-98.43,60) G7(-59.06,60) G8(-19.68,60) G9(20,60) G10(60,60) G11(99,60) G12(138,60) G13(178,60) G14(217,60) G15(256,60) G16(296,60) H1(-295.28,20) H2(-255.91,20) H3(-216.54,20) H4(-177.17,20) H5(-137.8,20) H6(-98.43,20) H7(-59.06,20) H8(-19.68,20) H9(20,20) H10(60,20) H11(99,20) H12(138,20) H13(178,20) H14(217,20) H15(256,20) H16(296,20) J1(-295.28,-19.68) J2(-255.91,-19.68) J3(-216.54,-19.68) J4(-177.17,-19.68) J5(-137.8,-19.68) J6(-98.43,-19.68) J7(-59.06,-19.68) J8(-19.68,-19.68) J9(20,-19.68) J10(60,-19.68) J11(99,-19.68) J12(138,-19.68) J13(178,-19.68) J14(217,-19.68) J15(256,-19.68) J16(296,-19.68) K1(-295.28,-59.06) K2(-255.91,-59.06) K3(-216.54,-59.06) K4(-177.17,-59.06) K5(-137.8,-59.06) K6(-98.43,-59.06) K7(-59.06,-59.06) K8(-19.68,-59.06) K9(20,-59.06) K10(60,-59.06) K11(99,-59.06) K12(138,-59.06) K13(178,-59.06) K14(217,-59.06) K15(256,-59.06) K16(296,-59.06) L1(-295.28,-98.43) L2(-255.91,-98.43) L3(-216.54,-98.43) L4(-177.17,-98.43) L5(-137.8,-98.43) L6(-98.43,-98.43) L7(-59.06,-98.43) L8(-19.68,-98.43) L9(20,-98.43) L10(60,-98.43) L11(99,-98.43) L12(138,-98.43) L13(178,-98.43) L14(217,-98.43) L15(256,-98.43) L16(296,-98.43) M1(-295.28,-137.8) M2(-255.91,-137.8) M3(-216.54,-137.8) M4(-177.17,-137.8) M5(-137.8,-137.8) M6(-98.43,-137.8) M7(-59.06,-137.8) M8(-19.68,-137.8) M9(20,-137.8) M10(60,-137.8) M11(99,-137.8) M12(138,-137.8) M13(178,-137.8) M14(217,-137.8) M15(256,-137.8) M16(296,-137.8) N1(-295.28,-177.17) N2(-255.91,-177.17) N3(-216.54,-177.17) N4(-177.17,-177.17) N5(-137.8,-177.17) N6(-98.43,-177.17) N7(-59.06,-177.17) N8(-19.68,-177.17) N9(20,-177.17) N10(60,-177.17) N11(99,-177.17) N12(138,-177.17) N13(178,-177.17) N14(217,-177.17) N15(256,-177.17) N16(296,-177.17) P1(-295.28,-216.54) P2(-255.91,-216.54) P3(-216.54,-216.54) P4(-177.17,-216.54) P5(-137.8,-216.54) P6(-98.43,-216.54) P7(-59.06,-216.54) P8(-19.68,-216.54) P9(20,-216.54) P10(60,-216.54) P11(99,-216.54) P12(138,-216.54) P13(178,-216.54) P14(217,-216.54) P15(256,-216.54) P16(296,-216.54) R1(-295.28,-255.91) R2(-255.91,-255.91) R3(-216.54,-255.91) R4(-177.17,-255.91) R5(-137.8,-255.91) R6(-98.43,-255.91) R7(-59.06,-255.91) R8(-19.68,-255.91) R9(20,-255.91) R10(60,-255.91) R11(99,-255.91) R12(138,-255.91) R13(178,-255.91) R14(217,-255.91) R15(256,-255.91) R16(296,-255.91) T1(-295.28,-295.28) T2(-255.91,-295.28) T3(-216.54,-295.28) T4(-177.17,-295.28) T5(-137.8,-295.28) T6(-98.43,-295.28) T7(-59.06,-295.28) T8(-19.68,-295.28) T9(20,-295.28) T10(60,-295.28) T11(99,-295.28) T12(138,-295.28) T13(178,-295.28) T14(217,-295.28) T15(256,-295.28) T16(296,-295.28)
Top Overlay:
  lines w8: -334.58,300 -299.21,335 ; -334.58,300 -334.58,-334.58 335,-334.58 335,335 -299.21,335 ; -334.58,300 -334.58,335 -299.21,335
Top Solder:
  drawing of 256 lines, arcs and shapes, not listed

## ZEN_S-PBGA-N196 [mil]
pads (196):
  rrect100% 28x28 smd: A1(-255.91,256) A2(-216.54,256) A3(-177.17,256) A4(-137.8,256) A5(-98.43,256) A6(-59.06,256) A7(-19.68,256) A8(20,256) A9(60,256) A10(99,256) A11(138,256) A12(178,256) A13(217,256) A14(256,256) B1(-255.91,217) B2(-216.54,217) B3(-177.17,217) B4(-137.8,217) B5(-98.43,217) B6(-59.06,217) B7(-19.68,217) B8(20,217) B9(60,217) B10(99,217) B11(138,217) B12(178,217) B13(217,217) B14(256,217) C1(-255.91,178) C2(-216.54,178) C3(-177.17,178) C4(-137.8,178) C5(-98.43,178) C6(-59.06,178) C7(-19.68,178) C8(20,178) C9(60,178) C10(99,178) C11(138,178) C12(178,178) C13(217,178) C14(256,178) D1(-255.91,138) D2(-216.54,138) D3(-177.17,138) D4(-137.8,138) D5(-98.43,138) D6(-59.06,138) D7(-19.68,138) D8(20,138) D9(60,138) D10(99,138) D11(138,138) D12(178,138) D13(217,138) D14(256,138) E1(-255.91,99) E2(-216.54,99) E3(-177.17,99) E4(-137.8,99) E5(-98.43,99) E6(-59.06,99) E7(-19.68,99) E8(20,99) E9(60,99) E10(99,99) E11(138,99) E12(178,99) E13(217,99) E14(256,99) F1(-255.91,60) F2(-216.54,60) F3(-177.17,60) F4(-137.8,60) F5(-98.43,60) F6(-59.06,60) F7(-19.68,60) F8(20,60) F9(60,60) F10(99,60) F11(138,60) F12(178,60) F13(217,60) F14(256,60) G1(-255.91,20) G2(-216.54,20) G3(-177.17,20) G4(-137.8,20) G5(-98.43,20) G6(-59.06,20) G7(-19.68,20) G8(20,20) G9(60,20) G10(99,20) G11(138,20) G12(178,20) G13(217,20) G14(256,20) H1(-255.91,-19.68) H2(-216.54,-19.68) H3(-177.17,-19.68) H4(-137.8,-19.68) H5(-98.43,-19.68) H6(-59.06,-19.68) H7(-19.68,-19.68) H8(20,-19.68) H9(60,-19.68) H10(99,-19.68) H11(138,-19.68) H12(178,-19.68) H13(217,-19.68) H14(256,-19.68) J1(-255.91,-59.06) J2(-216.54,-59.06) J3(-177.17,-59.06) J4(-137.8,-59.06) J5(-98.43,-59.06) J6(-59.06,-59.06) J7(-19.68,-59.06) J8(20,-59.06) J9(60,-59.06) J10(99,-59.06) J11(138,-59.06) J12(178,-59.06) J13(217,-59.06) J14(256,-59.06) K1(-255.91,-98.43) K2(-216.54,-98.43) K3(-177.17,-98.43) K4(-137.8,-98.43) K5(-98.43,-98.43) K6(-59.06,-98.43) K7(-19.68,-98.43) K8(20,-98.43) K9(60,-98.43) K10(99,-98.43) K11(138,-98.43) K12(178,-98.43) K13(217,-98.43) K14(256,-98.43) L1(-255.91,-137.8) L2(-216.54,-137.8) L3(-177.17,-137.8) L4(-137.8,-137.8) L5(-98.43,-137.8) L6(-59.06,-137.8) L7(-19.68,-137.8) L8(20,-137.8) L9(60,-137.8) L10(99,-137.8) L11(138,-137.8) L12(178,-137.8) L13(217,-137.8) L14(256,-137.8) M1(-255.91,-177.17) M2(-216.54,-177.17) M3(-177.17,-177.17) M4(-137.8,-177.17) M5(-98.43,-177.17) M6(-59.06,-177.17) M7(-19.68,-177.17) M8(20,-177.17) M9(60,-177.17) M10(99,-177.17) M11(138,-177.17) M12(178,-177.17) M13(217,-177.17) M14(256,-177.17) N1(-255.91,-216.54) N2(-216.54,-216.54) N3(-177.17,-216.54) N4(-137.8,-216.54) N5(-98.43,-216.54) N6(-59.06,-216.54) N7(-19.68,-216.54) N8(20,-216.54) N9(60,-216.54) N10(99,-216.54) N11(138,-216.54) N12(178,-216.54) N13(217,-216.54) N14(256,-216.54) P1(-255.91,-255.91) P2(-216.54,-255.91) P3(-177.17,-255.91) P4(-137.8,-255.91) P5(-98.43,-255.91) P6(-59.06,-255.91) P7(-19.68,-255.91) P8(20,-255.91) P9(60,-255.91) P10(99,-255.91) P11(138,-255.91) P12(178,-255.91) P13(217,-255.91) P14(256,-255.91)
Top Overlay:
  lines w8: -295.21,260 -259.84,296 ; -295.21,260 -295.21,-295.21 296,-295.21 296,296 -259.84,296 ; -295.21,260 -295.21,296 -259.84,296
Top Solder:
  drawing of 196 lines, arcs and shapes, not listed

## ZKB_S-PBGA-N256 [mil]
pads (256):
  rrect100% 28x28 smd: A1(-295.28,296) A2(-255.91,296) A3(-216.54,296) A4(-177.17,296) A5(-137.8,296) A6(-98.43,296) A7(-59.06,296) A8(-19.68,296) A9(20,296) A10(60,296) A11(99,296) A12(138,296) A13(178,296) A14(217,296) A15(256,296) A16(296,296) B1(-295.28,256) B2(-255.91,256) B3(-216.54,256) B4(-177.17,256) B5(-137.8,256) B6(-98.43,256) B7(-59.06,256) B8(-19.68,256) B9(20,256) B10(60,256) B11(99,256) B12(138,256) B13(178,256) B14(217,256) B15(256,256) B16(296,256) C1(-295.28,217) C2(-255.91,217) C3(-216.54,217) C4(-177.17,217) C5(-137.8,217) C6(-98.43,217) C7(-59.06,217) C8(-19.68,217) C9(20,217) C10(60,217) C11(99,217) C12(138,217) C13(178,217) C14(217,217) C15(256,217) C16(296,217) D1(-295.28,178) D2(-255.91,178) D3(-216.54,178) D4(-177.17,178) D5(-137.8,178) D6(-98.43,178) D7(-59.06,178) D8(-19.68,178) D9(20,178) D10(60,178) D11(99,178) D12(138,178) D13(178,178) D14(217,178) D15(256,178) D16(296,178) E1(-295.28,138) E2(-255.91,138) E3(-216.54,138) E4(-177.17,138) E5(-137.8,138) E6(-98.43,138) E7(-59.06,138) E8(-19.68,138) E9(20,138) E10(60,138) E11(99,138) E12(138,138) E13(178,138) E14(217,138) E15(256,138) E16(296,138) F1(-295.28,99) F2(-255.91,99) F3(-216.54,99) F4(-177.17,99) F5(-137.8,99) F6(-98.43,99) F7(-59.06,99) F8(-19.68,99) F9(20,99) F10(60,99) F11(99,99) F12(138,99) F13(178,99) F14(217,99) F15(256,99) F16(296,99) G1(-295.28,60) G2(-255.91,60) G3(-216.54,60) G4(-177.17,60) G5(-137.8,60) G6(-98.43,60) G7(-59.06,60) G8(-19.68,60) G9(20,60) G10(60,60) G11(99,60) G12(138,60) G13(178,60) G14(217,60) G15(256,60) G16(296,60) H1(-295.28,20) H2(-255.91,20) H3(-216.54,20) H4(-177.17,20) H5(-137.8,20) H6(-98.43,20) H7(-59.06,20) H8(-19.68,20) H9(20,20) H10(60,20) H11(99,20) H12(138,20) H13(178,20) H14(217,20) H15(256,20) H16(296,20) J1(-295.28,-19.68) J2(-255.91,-19.68) J3(-216.54,-19.68) J4(-177.17,-19.68) J5(-137.8,-19.68) J6(-98.43,-19.68) J7(-59.06,-19.68) J8(-19.68,-19.68) J9(20,-19.68) J10(60,-19.68) J11(99,-19.68) J12(138,-19.68) J13(178,-19.68) J14(217,-19.68) J15(256,-19.68) J16(296,-19.68) K1(-295.28,-59.06) K2(-255.91,-59.06) K3(-216.54,-59.06) K4(-177.17,-59.06) K5(-137.8,-59.06) K6(-98.43,-59.06) K7(-59.06,-59.06) K8(-19.68,-59.06) K9(20,-59.06) K10(60,-59.06) K11(99,-59.06) K12(138,-59.06) K13(178,-59.06) K14(217,-59.06) K15(256,-59.06) K16(296,-59.06) L1(-295.28,-98.43) L2(-255.91,-98.43) L3(-216.54,-98.43) L4(-177.17,-98.43) L5(-137.8,-98.43) L6(-98.43,-98.43) L7(-59.06,-98.43) L8(-19.68,-98.43) L9(20,-98.43) L10(60,-98.43) L11(99,-98.43) L12(138,-98.43) L13(178,-98.43) L14(217,-98.43) L15(256,-98.43) L16(296,-98.43) M1(-295.28,-137.8) M2(-255.91,-137.8) M3(-216.54,-137.8) M4(-177.17,-137.8) M5(-137.8,-137.8) M6(-98.43,-137.8) M7(-59.06,-137.8) M8(-19.68,-137.8) M9(20,-137.8) M10(60,-137.8) M11(99,-137.8) M12(138,-137.8) M13(178,-137.8) M14(217,-137.8) M15(256,-137.8) M16(296,-137.8) N1(-295.28,-177.17) N2(-255.91,-177.17) N3(-216.54,-177.17) N4(-177.17,-177.17) N5(-137.8,-177.17) N6(-98.43,-177.17) N7(-59.06,-177.17) N8(-19.68,-177.17) N9(20,-177.17) N10(60,-177.17) N11(99,-177.17) N12(138,-177.17) N13(178,-177.17) N14(217,-177.17) N15(256,-177.17) N16(296,-177.17) P1(-295.28,-216.54) P2(-255.91,-216.54) P3(-216.54,-216.54) P4(-177.17,-216.54) P5(-137.8,-216.54) P6(-98.43,-216.54) P7(-59.06,-216.54) P8(-19.68,-216.54) P9(20,-216.54) P10(60,-216.54) P11(99,-216.54) P12(138,-216.54) P13(178,-216.54) P14(217,-216.54) P15(256,-216.54) P16(296,-216.54) R1(-295.28,-255.91) R2(-255.91,-255.91) R3(-216.54,-255.91) R4(-177.17,-255.91) R5(-137.8,-255.91) R6(-98.43,-255.91) R7(-59.06,-255.91) R8(-19.68,-255.91) R9(20,-255.91) R10(60,-255.91) R11(99,-255.91) R12(138,-255.91) R13(178,-255.91) R14(217,-255.91) R15(256,-255.91) R16(296,-255.91) T1(-295.28,-295.28) T2(-255.91,-295.28) T3(-216.54,-295.28) T4(-177.17,-295.28) T5(-137.8,-295.28) T6(-98.43,-295.28) T7(-59.06,-295.28) T8(-19.68,-295.28) T9(20,-295.28) T10(60,-295.28) T11(99,-295.28) T12(138,-295.28) T13(178,-295.28) T14(217,-295.28) T15(256,-295.28) T16(296,-295.28)
Top Overlay:
  lines w8: -334.58,300 -334.58,335 -299.21,335 ; -334.58,300 -334.58,-334.58 335,-334.58 335,335 -299.21,335 ; -334.58,300 -299.21,335
Top Solder:
  drawing of 256 lines, arcs and shapes, not listed

## ZUN_SPBGA-N561 [mil]
pads (561):
  rrect100% 24x24 smd: A1(-409.45,410) A2(-377.95,410) A3(-346.46,410) A4(-314.96,410) A5(-283.46,410) A6(-251.97,410) A7(-220.47,410) A8(-188.98,410) A9(-157.48,410) A10(-125.98,410) A11(-94.49,410) A12(-62.99,410) A13(-31.5,410) A14(0,410) A15(32,410) A16(63,410) A17(95,410) A18(126,410) A19(158,410) A20(189,410) A21(221,410) A22(252,410) A23(284,410) A24(315,410) A25(347,410) A26(378,410) A27(410,410) AA1(-409.45,-220.47) AA2(-377.95,-220.47) AA3(-346.46,-220.47) AA4(-314.96,-220.47) AA5(-283.46,-220.47) AA23(284,-220.47) AA24(315,-220.47) AA25(347,-220.47) AA26(378,-220.47) AA27(410,-220.47) AB1(-409.45,-251.97) AB2(-377.95,-251.97) AB3(-346.46,-251.97) AB4(-314.96,-251.97) AB5(-283.46,-251.97) AB23(284,-251.97) AB24(315,-251.97) AB25(347,-251.97) AB26(378,-251.97) AB27(410,-251.97) AC1(-409.45,-283.46) AC2(-377.95,-283.46) AC3(-346.46,-283.46) AC4(-314.96,-283.46) AC5(-283.46,-283.46) AC6(-251.97,-283.46) AC7(-220.47,-283.46) AC8(-188.98,-283.46) AC9(-157.48,-283.46) AC10(-125.98,-283.46) AC11(-94.49,-283.46) AC12(-62.99,-283.46) AC13(-31.5,-283.46) AC14(0,-283.46) AC15(32,-283.46) AC16(63,-283.46) AC17(95,-283.46) AC18(126,-283.46) AC19(158,-283.46) AC20(189,-283.46) AC21(221,-283.46) AC22(252,-283.46) AC23(284,-283.46) AC24(315,-283.46) AC25(347,-283.46) AC26(378,-283.46) AC27(410,-283.46) AD1(-409.45,-314.96) AD2(-377.95,-314.96) AD3(-346.46,-314.96) AD4(-314.96,-314.96) AD5(-283.46,-314.96) AD6(-251.97,-314.96) AD7(-220.47,-314.96) AD8(-188.98,-314.96) AD9(-157.48,-314.96) AD10(-125.98,-314.96) AD11(-94.49,-314.96) AD12(-62.99,-314.96) AD13(-31.5,-314.96) AD14(0,-314.96) AD15(32,-314.96) AD16(63,-314.96) AD17(95,-314.96) AD18(126,-314.96) AD19(158,-314.96) AD20(189,-314.96) AD21(221,-314.96) AD22(252,-314.96) AD23(284,-314.96) AD24(315,-314.96) AD25(347,-314.96) AD26(378,-314.96) AD27(410,-314.96) AE1(-409.45,-346.46) AE2(-377.95,-346.46) AE3(-346.46,-346.46) AE4(-314.96,-346.46) AE5(-283.46,-346.46) AE6(-251.97,-346.46) AE7(-220.47,-346.46) AE8(-188.98,-346.46) AE9(-157.48,-346.46) AE10(-125.98,-346.46) AE11(-94.49,-346.46) AE12(-62.99,-346.46) AE13(-31.5,-346.46) AE14(0,-346.46) AE15(32,-346.46) AE16(63,-346.46) AE17(95,-346.46) AE18(126,-346.46) AE19(158,-346.46) AE20(189,-346.46) AE21(221,-346.46) AE22(252,-346.46) AE23(284,-346.46) AE24(315,-346.46) AE25(347,-346.46) AE26(378,-346.46) AE27(410,-346.46) AF1(-409.45,-377.95) AF2(-377.95,-377.95) AF3(-346.46,-377.95) AF4(-314.96,-377.95) AF5(-283.46,-377.95) AF6(-251.97,-377.95) AF7(-220.47,-377.95) AF8(-188.98,-377.95) AF9(-157.48,-377.95) AF10(-125.98,-377.95) AF11(-94.49,-377.95) AF12(-62.99,-377.95) AF13(-31.5,-377.95) AF14(0,-377.95) AF15(32,-377.95) AF16(63,-377.95) AF17(95,-377.95) AF18(126,-377.95) AF19(158,-377.95) AF20(189,-377.95) AF21(221,-377.95) AF22(252,-377.95) AF23(284,-377.95) AF24(315,-377.95) AF25(347,-377.95) AF26(378,-377.95) AF27(410,-377.95) AG1(-409.45,-409.45) AG2(-377.95,-409.45) AG3(-346.46,-409.45) AG4(-314.96,-409.45) AG5(-283.46,-409.45) AG6(-251.97,-409.45) AG7(-220.47,-409.45) AG8(-188.98,-409.45) AG9(-157.48,-409.45) AG10(-125.98,-409.45) AG11(-94.49,-409.45) AG12(-62.99,-409.45) AG13(-31.5,-409.45) AG14(0,-409.45) AG15(32,-409.45) AG16(63,-409.45) AG17(95,-409.45) AG18(126,-409.45) AG19(158,-409.45) AG20(189,-409.45) AG21(221,-409.45) AG22(252,-409.45) AG23(284,-409.45) AG24(315,-409.45) AG25(347,-409.45) AG26(378,-409.45) AG27(410,-409.45) B1(-409.45,378) B2(-377.95,378) B3(-346.46,378) B4(-314.96,378) B5(-283.46,378) B6(-251.97,378) B7(-220.47,378) B8(-188.98,378) B9(-157.48,378) B10(-125.98,378) B11(-94.49,378) B12(-62.99,378) B13(-31.5,378) B14(0,378) B15(32,378) B16(63,378) B17(95,378) B18(126,378) B19(158,378) B20(189,378) B21(221,378) B22(252,378) B23(284,378) B24(315,378) B25(347,378) B26(378,378) B27(410,378) C1(-409.45,347) C2(-377.95,347) C3(-346.46,347) C4(-314.96,347) C5(-283.46,347) C6(-251.97,347) C7(-220.47,347) C8(-188.98,347) C9(-157.48,347) C10(-125.98,347) C11(-94.49,347) C12(-62.99,347) C13(-31.5,347) C14(0,347) C15(32,347) C16(63,347) C17(95,347) C18(126,347) C19(158,347) C20(189,347) C21(221,347) C22(252,347) C23(284,347) C24(315,347) C25(347,347) C26(378,347) C27(410,347) D1(-409.45,315) D2(-377.95,315) D3(-346.46,315) D4(-314.96,315) D5(-283.46,315) D6(-251.97,315) D7(-220.47,315) D8(-188.98,315) D9(-157.48,315) D10(-125.98,315) D11(-94.49,315) D12(-62.99,315) D13(-31.5,315) D14(0,315) D15(32,315) D16(63,315) D17(95,315) D18(126,315) D19(158,315) D20(189,315) D21(221,315) D22(252,315) D23(284,315) D24(315,315) D25(347,315) D26(378,315) D27(410,315) E1(-409.45,284) E2(-377.95,284) E3(-346.46,284) E4(-314.96,284) E5(-283.46,284) E6(-251.97,284) E7(-220.47,284) E8(-188.98,284) E9(-157.48,284) E10(-125.98,284) E11(-94.49,284) E12(-62.99,284) E13(-31.5,284) E14(0,284) E15(32,284) E16(63,284) E17(95,284) E18(126,284) E19(158,284) E20(189,284) E21(221,284) E22(252,284) E23(284,284) E24(315,284) E25(347,284) E26(378,284) E27(410,284) F1(-409.45,252) F2(-377.95,252) F3(-346.46,252) F4(-314.96,252) F5(-283.46,252) F23(284,252) F24(315,252) F25(347,252) F26(378,252) F27(410,252) G1(-409.45,221) G2(-377.95,221) G3(-346.46,221) G4(-314.96,221) G5(-283.46,221) G23(284,221) G24(315,221) G25(347,221) G26(378,221) G27(410,221) H1(-409.45,189) H2(-377.95,189) H3(-346.46,189) H4(-314.96,189) H5(-283.46,189) H23(284,189) H24(315,189) H25(347,189) H26(378,189) H27(410,189) J1(-409.45,158) J2(-377.95,158) J3(-346.46,158) J4(-314.96,158) J5(-283.46,158) J9(-157.48,158) J10(-125.98,158) J11(-94.49,158) J12(-62.99,158) J13(-31.5,158) J14(0,158) J15(32,158) J16(63,158) J17(95,158) J18(126,158) J19(158,158) J23(284,158) J24(315,158) J25(347,158) J26(378,158) J27(410,158) K1(-409.45,126) K2(-377.95,126) K3(-346.46,126) K4(-314.96,126) K5(-283.46,126) K9(-157.48,126) K10(-125.98,126) K11(-94.49,126) K12(-62.99,126) K13(-31.5,126) K14(0,126) K15(32,126) K16(63,126) K17(95,126) K18(126,126) K19(158,126) K23(284,126) K24(315,126) K25(347,126) K26(378,126) K27(410,126) L1(-409.45,95) L2(-377.95,95) L3(-346.46,95) L4(-314.96,95) L5(-283.46,95) L9(-157.48,95) L10(-125.98,95) L11(-94.49,95) L12(-62.99,95) L13(-31.5,95) L14(0,95) L15(32,95) L16(63,95) L17(95,95) L18(126,95) L19(158,95) L23(284,95) L24(315,95) L25(347,95) L26(378,95) L27(410,95) M1(-409.45,63) M2(-377.95,63) M3(-346.46,63) M4(-314.96,63) M5(-283.46,63) M9(-157.48,63) M10(-125.98,63) M11(-94.49,63) M12(-62.99,63) M13(-31.5,63) M14(0,63) M15(32,63) M16(63,63) M17(95,63) M18(126,63) M19(158,63) M23(284,63) M24(315,63) M25(347,63) M26(378,63) M27(410,63) N1(-409.45,32) N2(-377.95,32) N3(-346.46,32) N4(-314.96,32) N5(-283.46,32) N9(-157.48,32) N10(-125.98,32) N11(-94.49,32) N12(-62.99,32) N13(-31.5,32) N14(0,32) N15(32,32) N16(63,32) N17(95,32) N18(126,32) N19(158,32) N23(284,32) N24(315,32) N25(347,32) N26(378,32) N27(410,32) P1(-409.45,0) P2(-377.95,0) P3(-346.46,0) P4(-314.96,0) P5(-283.46,0) P9(-157.48,0) P10(-125.98,0) P11(-94.49,0) P12(-62.99,0) P13(-31.5,0) P14(0,0) P15(32,0) P16(63,0) P17(95,0) P18(126,0) P19(158,0) P23(284,0) P24(315,0) P25(347,0) P26(378,0) P27(410,0) R1(-409.45,-31.5) R2(-377.95,-31.5) R3(-346.46,-31.5) R4(-314.96,-31.5) R5(-283.46,-31.5) R9(-157.48,-31.5) R10(-125.98,-31.5) R11(-94.49,-31.5) R12(-62.99,-31.5) R13(-31.5,-31.5) R14(0,-31.5) R15(32,-31.5) R16(63,-31.5) R17(95,-31.5) R18(126,-31.5) R19(158,-31.5) R23(284,-31.5) R24(315,-31.5) R25(347,-31.5) R26(378,-31.5) R27(410,-31.5) T1(-409.45,-62.99) T2(-377.95,-62.99) T3(-346.46,-62.99) T4(-314.96,-62.99) T5(-283.46,-62.99) T9(-157.48,-62.99) T10(-125.98,-62.99) T11(-94.49,-62.99) T12(-62.99,-62.99) T13(-31.5,-62.99) T14(0,-62.99) T15(32,-62.99) T16(63,-62.99) T17(95,-62.99) T18(126,-62.99) T19(158,-62.99) T23(284,-62.99) T24(315,-62.99) T25(347,-62.99) T26(378,-62.99) T27(410,-62.99) U1(-409.45,-94.49) U2(-377.95,-94.49) U3(-346.46,-94.49) U4(-314.96,-94.49) U5(-283.46,-94.49) U9(-157.48,-94.49) U10(-125.98,-94.49) U11(-94.49,-94.49) U12(-62.99,-94.49) U13(-31.5,-94.49) U14(0,-94.49) U15(32,-94.49) U16(63,-94.49) U17(95,-94.49) U18(126,-94.49) U19(158,-94.49) U23(284,-94.49) U24(315,-94.49) U25(347,-94.49) U26(378,-94.49) U27(410,-94.49) V1(-409.45,-125.98) V2(-377.95,-125.98) V3(-346.46,-125.98) V4(-314.96,-125.98) V5(-283.46,-125.98) V9(-157.48,-125.98) V10(-125.98,-125.98) V11(-94.49,-125.98) V12(-62.99,-125.98) V13(-31.5,-125.98) V14(0,-125.98) V15(32,-125.98) V16(63,-125.98) V17(95,-125.98) V18(126,-125.98) V19(158,-125.98) V23(284,-125.98) V24(315,-125.98) V25(347,-125.98) V26(378,-125.98) V27(410,-125.98) W1(-409.45,-157.48) W2(-377.95,-157.48) W3(-346.46,-157.48) W4(-314.96,-157.48) W5(-283.46,-157.48) W9(-157.48,-157.48) W10(-125.98,-157.48) W11(-94.49,-157.48) W12(-62.99,-157.48) W13(-31.5,-157.48) W14(0,-157.48) W15(32,-157.48) W16(63,-157.48) W17(95,-157.48) W18(126,-157.48) W19(158,-157.48) W23(284,-157.48) W24(315,-157.48) W25(347,-157.48) W26(378,-157.48) W27(410,-157.48) Y1(-409.45,-188.98) Y2(-377.95,-188.98) Y3(-346.46,-188.98) Y4(-314.96,-188.98) Y5(-283.46,-188.98) Y23(284,-188.98) Y24(315,-188.98) Y25(347,-188.98) Y26(378,-188.98) Y27(410,-188.98)
Top Overlay:
  lines w8: -450.72,424 -450.72,451 -423.23,451 ; -450.72,424 -450.72,-450.72 451,-450.72 451,451 -423.23,451 ; -450.72,424 -423.23,451
Top Solder:
  drawing of 561 lines, arcs and shapes, not listed